# Altium footprint library Connectors.PcbLib: 51 footprints (part 4 of 4)
Each footprint in its own frame and in the unit in brackets; x right, y up, seen from the top. Pads: shape width x height; smd on the part's side, far side on the other; paste and mask are expansions set on the pad; w line width, h text height; cw(c..) or ccw(c..) is an arc to the next point about the centre after c.
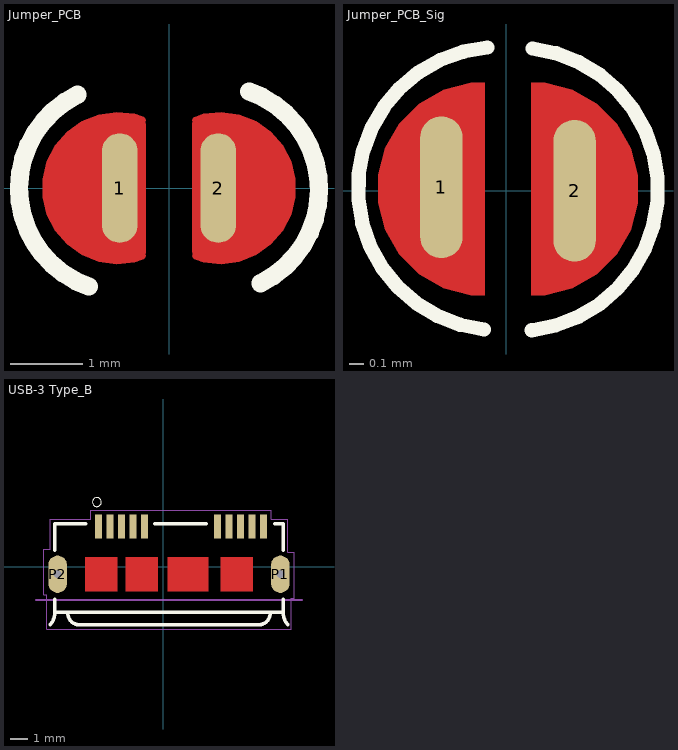
[diagram p3: the footprints below, top view; thin cyan lines are the x and y axes]

## Jumper_PCB [mil]
pads (2):
  oval 19.68x60 smd: 1(-27,0) 2(27,0)
Top Layer:
  region: 14.16,38.97 18.84,40.63 28.71,41.64 38.55,40.29 47.79,36.65 55.9,30.93 62.43,23.44 67,14.63 69.35,4.98 69.36,-4.94 67.01,-14.59 62.45,-23.41 55.93,-30.9 47.82,-36.63 38.59,-40.28 28.75,-41.64 18.87,-40.64 14.19,-38.98 13.9,-38.88 13.41,-38.51 13.06,-38 12.87,-37.42 12.87,-37.11 12.87,-36.99 12.9,-36.74 12.97,-36.49 13.06,-36.26 13.12,-36.15 13.06,-36.04 12.97,-35.81 12.9,-35.57 12.87,-35.32 12.87,-35.19 12.87,35.67 12.87,35.76 12.89,35.93 12.92,36.1 12.96,36.26 12.99,36.34 12.95,36.43 12.89,36.62 12.86,36.81 12.84,37 12.84,37.1 12.84,37.41 13.02,37.99 13.38,38.49 13.87,38.87
  region: -14.16,-38.97 -18.84,-40.63 -28.71,-41.64 -38.55,-40.29 -47.79,-36.65 -55.9,-30.93 -62.43,-23.44 -67,-14.63 -69.35,-4.98 -69.36,4.94 -67.01,14.59 -62.45,23.41 -55.93,30.9 -47.82,36.63 -38.59,40.28 -28.75,41.64 -18.87,40.64 -14.19,38.98 -13.9,38.88 -13.41,38.51 -13.06,38 -12.87,37.42 -12.87,37.11 -12.87,36.99 -12.9,36.74 -12.97,36.49 -13.06,36.26 -13.12,36.15 -13.06,36.04 -12.97,35.81 -12.9,35.57 -12.87,35.32 -12.87,35.19 -12.87,-35.67 -12.87,-35.76 -12.89,-35.93 -12.92,-36.1 -12.96,-36.26 -12.99,-36.34 -12.95,-36.43 -12.89,-36.62 -12.86,-36.81 -12.84,-37 -12.84,-37.1 -12.84,-37.41 -13.02,-37.99 -13.38,-38.49 -13.87,-38.87
Top Overlay:
  lines w10: -50.14,51.23 ccw(c-25.17,-0.1) -44.02,-53.99 ; 44.02,52.99 cw(c25.17,-0.9) 50.14,-52.23

## Jumper_PCB_Sig [mm]
pads (2):
  oval 0.3x1 smd: 1(-0.457,0.025) 2(0.483,0)
Top Layer:
  region: 0.178,0.762 0.277,0.762 0.467,0.711 0.638,0.612 0.778,0.473 0.877,0.301 0.928,0.111 0.928,-0.087 0.877,-0.277 0.778,-0.449 0.638,-0.588 0.467,-0.687 0.277,-0.738 0.178,-0.738
  region: -0.152,-0.737 -0.251,-0.737 -0.442,-0.685 -0.613,-0.587 -0.753,-0.447 -0.851,-0.276 -0.902,-0.085 -0.902,0.112 -0.851,0.303 -0.753,0.474 -0.613,0.614 -0.442,0.712 -0.251,0.763 -0.152,0.763
Top Overlay:
  lines w0.1: -0.157,-0.979 cw(c-0.045,0.015) -0.133,1.011 ; 0.18,-0.984 ccw(c0.071,0.01) 0.185,1.004

## USB-3 Type_B [mm]
pads (12):
  rect 0.4x1.35 smd: 1(-3.658,2.264) 2(-3.008,2.264) 3(-2.358,2.264) 4(-1.708,2.264) 5(-1.058,2.264) 6(3.042,2.264) 7(3.692,2.264) 8(4.342,2.264) 9(4.992,2.264) 10(5.642,2.264)
  oval 1.05x2.1 hole 0.45: P1(6.592,-0.411) P2(-5.958,-0.411)
Top Layer:
  region: 3.243,0.539 5.042,0.539 5.042,-1.361 3.243,-1.361
  region: 0.242,0.539 2.542,0.539 2.542,-1.361 0.242,-1.361
  region: -2.109,0.539 -0.308,0.539 -0.308,-1.362 -2.109,-1.362
  region: -4.414,0.539 -2.608,0.539 -2.608,-1.362 -4.414,-1.362
Top Overlay:
  circle w0: c-3.747,3.653 r0.254
  lines w0.2: -6.379,-3.257 ccw(c-7.121,-2.565) -6.108,-2.512 ; -6.108,-1.811 -6.108,-2.511 -6.108,-2.561 -5.383,-2.561 6.017,-2.561 6.742,-2.561 6.742,-2.511 6.742,-1.811 ; -6.108,0.939 -6.108,2.439 -4.383,2.439 ; -5.383,-2.566 ccw(c-4.733,-2.611) -4.778,-3.261 ; -4.783,-3.261 5.417,-3.261 ; -0.483,2.439 2.417,2.439 ; 5.412,-3.261 ccw(c5.367,-2.611) 6.017,-2.566 ; 6.267,2.439 6.742,2.439 6.742,0.939 ; 6.742,-2.512 ccw(c7.755,-2.565) 7.013,-3.257
Top Paste:
  region: 3.245,0.539 5.042,0.539 5.042,-1.362 3.245,-1.362
  region: 0.242,0.539 2.542,0.539 2.542,-1.362 0.242,-1.362
  region: -2.109,0.539 -0.308,0.539 -0.308,-1.361 -2.109,-1.361
  region: -4.409,0.539 -2.608,0.539 -2.608,-1.361 -4.409,-1.361
Top Solder:
  region: 3.045,0.689 5.242,0.689 5.242,-1.512 3.045,-1.512
  region: 0.042,0.689 2.742,0.689 2.742,-1.513 0.042,-1.513
  region: -2.259,0.689 -0.158,0.689 -0.158,-1.511 -2.259,-1.511
  region: -4.558,0.689 -2.458,0.689 -2.458,-1.511 -4.558,-1.511
Mechanical 1:
  lines w0: -6.183,-0.811 ccw(c-5.958,-0.811) -5.958,-1.036 ccw(c-5.958,-0.811) -5.733,-0.811 -5.733,-0.011 ccw(c-5.958,-0.011) -5.958,0.214 ccw(c-5.958,-0.011) -6.183,-0.011 -6.183,-0.811 ; 6.367,-0.811 ccw(c6.592,-0.811) 6.592,-1.036 ccw(c6.592,-0.811) 6.817,-0.811 6.817,-0.011 ccw(c6.592,-0.011) 6.592,0.214 ccw(c6.592,-0.011) 6.367,-0.011 6.367,-0.811
  lines w0.05: -6.733,-1.561 -6.733,0.989 -6.383,0.989 -6.383,2.689 -4.083,2.689 -4.083,3.189 6.067,3.189 6.067,2.689 7.017,2.689 7.017,0.839 7.367,0.839 7.367,-1.761 7.217,-1.761 7.217,-3.511 -6.583,-3.511 -6.583,-1.561 -6.733,-1.561
  lines w0.1: -7.183,-1.861 7.817,-1.861
3D body "USB3120-30-A_revD.STEP": height 2.78, standoff -0.95, extent -6.336,-3.521 7.05,2.421